# Altium footprint library 13-IC Packages-2smt4e.PcbLib: 49 footprints (part 4 of 4)
Each footprint in its own frame and in the unit in brackets; x right, y up, seen from the top. Pads: shape width x height; smd on the part's side, far side on the other; paste and mask are expansions set on the pad; w line width, h text height; cw(c..) or ccw(c..) is an arc to the next point about the centre after c.
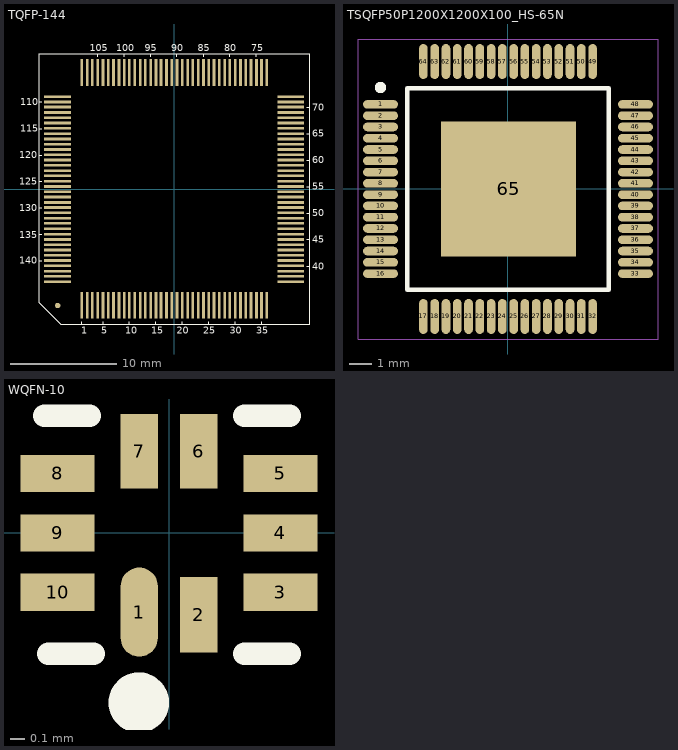
[diagram p3: the footprints below, top view; thin cyan lines are the x and y axes]

## TQFP-144 [mil]
pads (145):
  round 20 smd: 0(-434,-434)
  rect 10x100 smd: 1(-344,-433) 2(-324,-433) 3(-305,-433) 4(-285,-433) 5(-265,-433) 6(-246,-433) 7(-226,-433) 8(-206,-433) 9(-186,-433) 10(-167,-433) 11(-147,-433) 12(-127,-433) 13(-108,-433) 14(-88,-433) 15(-68,-433) 16(-49,-433) 17(-29,-433) 18(-9,-433) 19(10,-433) 20(30,-433) 21(50,-433) 22(69,-433) 23(89,-433) 24(109,-433) 25(128,-433) 26(148,-433) 27(168,-433) 28(188,-433) 29(207,-433) 30(227,-433) 31(247,-433) 32(266,-433) 33(286,-433) 34(306,-433) 35(325,-433) 36(345,-433) 73(345,434) 74(325,434) 75(306,434) 76(286,434) 77(266,434) 78(247,434) 79(227,434) 80(207,434) 81(188,434) 82(168,434) 83(148,434) 84(128,434) 85(109,434) 86(89,434) 87(69,434) 88(50,434) 89(30,434) 90(10,434) 91(-9,434) 92(-29,434) 93(-49,434) 94(-68,434) 95(-88,434) 96(-108,434) 97(-127,434) 98(-147,434) 99(-167,434) 100(-186,434) 101(-206,434) 102(-226,434) 103(-246,434) 104(-265,434) 105(-285,434) 106(-305,434) 107(-324,434) 108(-344,434)
  rect 100x10 smd: 37(434,-345) 38(434,-325) 39(434,-306) 40(434,-286) 41(434,-266) 42(434,-247) 43(434,-227) 44(434,-207) 45(434,-188) 46(434,-168) 47(434,-148) 48(434,-128) 49(434,-109) 50(434,-89) 51(434,-69) 52(434,-50) 53(434,-30) 54(434,-10) 55(434,9) 56(434,29) 57(434,49) 58(434,68) 59(434,88) 60(434,108) 61(434,127) 62(434,147) 63(434,167) 64(434,186) 65(434,206) 66(434,226) 67(434,246) 68(434,265) 69(434,285) 70(434,305) 71(434,324) 72(434,344) 109(-434,344) 110(-434,324) 111(-434,305) 112(-434,285) 113(-434,265) 114(-434,246) 115(-434,226) 116(-434,206) 117(-434,186) 118(-434,167) 119(-434,147) 120(-434,127) 121(-434,108) 122(-434,88) 123(-434,68) 124(-434,49) 125(-434,29) 126(-434,9) 127(-434,-10) 128(-434,-30) 129(-434,-50) 130(-434,-69) 131(-434,-89) 132(-434,-109) 133(-434,-128) 134(-434,-148) 135(-434,-168) 136(-434,-188) 137(-434,-207) 138(-434,-227) 139(-434,-247) 140(-434,-266) 141(-434,-286) 142(-434,-306) 143(-434,-325) 144(-434,-345)
Top Overlay:
  lines w2: -503,-267 -493,-267 ; -503,-168 -493,-168 ; -503,-70 -493,-70 ; -503,28 -493,28 ; -503,126 -493,126 ; -503,225 -493,225 ; -503,324 -493,324 ; -344,-504 -344,-494 ; -285,493 -285,503 ; -265,-504 -265,-494 ; -186,493 -186,503 ; -167,-504 -167,-494 ; -88,493 -88,503 ; -68,-504 -68,-494 ; 10,493 10,503 ; 30,-504 30,-494 ; 109,493 109,503 ; 128,-504 128,-494 ; 207,493 207,503 ; 227,-504 227,-494 ; 306,493 306,503 ; 325,-504 325,-494 ; 494,-287 504,-287 ; 494,-188 504,-188 ; 494,-90 504,-90 ; 494,8 504,8 ; 494,107 504,107 ; 494,206 504,206 ; 494,305 504,305 ; -503,-424 -503,503 504,503 504,-504 -423,-504 -503,-424
  text "140" at -578,-279 h26
  text "135" at -578,-183 h26
  text "130" at -577,-83 h26
  text "125" at -577,15 h26
  text "120" at -577,115 h26
  text "115" at -573,214 h26
  text "110" at -574,312 h26
  text "105" at -315,513 h26
  text "100" at -216,513 h26
  text "95" at -109,513 h26
  text "90" at -11,513 h26
  text "85" at 87,513 h26
  text "80" at 186,513 h26
  text "75" at 286,513 h26
  text "70" at 513,292 h26
  text "65" at 513,194 h26
  text "60" at 513,95 h26
  text "55" at 513,-3 h26
  text "50" at 513,-101 h26
  text "45" at 513,-200 h26
  text "40" at 513,-301 h26
  text "35" at 306,-539 h26
  text "30" at 207,-539 h26
  text "25" at 108,-539 h26
  text "20" at 10,-539 h26
  text "15" at -85,-539 h26
  text "10" at -183,-539 h26
  text "5" at -272,-539 h26
  text "1" at -346,-539 h26
3D body "quad144.stp": height 59.06, standoff 0, extent -433.07,-433.06 433.08,433.08

## TSQFP50P1200X1200X100_HS-65N [mm]
pads (65):
  oval 1.55x0.38 smd mask+0.051: 1(-5.65,3.75) 2(-5.65,3.25) 3(-5.65,2.75) 4(-5.65,2.25) 5(-5.65,1.75) 6(-5.65,1.25) 7(-5.65,0.75) 8(-5.65,0.25) 9(-5.65,-0.25) 10(-5.65,-0.75) 11(-5.65,-1.25) 12(-5.65,-1.75) 13(-5.65,-2.25) 14(-5.65,-2.75) 15(-5.65,-3.25) 16(-5.65,-3.75) 33(5.65,-3.75) 34(5.65,-3.25) 35(5.65,-2.75) 36(5.65,-2.25) 37(5.65,-1.75) 38(5.65,-1.25) 39(5.65,-0.75) 40(5.65,-0.25) 41(5.65,0.25) 42(5.65,0.75) 43(5.65,1.25) 44(5.65,1.75) 45(5.65,2.25) 46(5.65,2.75) 47(5.65,3.25) 48(5.65,3.75)
  oval 0.38x1.55 smd mask+0.051: 17(-3.75,-5.65) 18(-3.25,-5.65) 19(-2.75,-5.65) 20(-2.25,-5.65) 21(-1.75,-5.65) 22(-1.25,-5.65) 23(-0.75,-5.65) 24(-0.25,-5.65) 25(0.25,-5.65) 26(0.75,-5.65) 27(1.25,-5.65) 28(1.75,-5.65) 29(2.25,-5.65) 30(2.75,-5.65) 31(3.25,-5.65) 32(3.75,-5.65) 49(3.75,5.65) 50(3.25,5.65) 51(2.75,5.65) 52(2.25,5.65) 53(1.75,5.65) 54(1.25,5.65) 55(0.75,5.65) 56(0.25,5.65) 57(-0.25,5.65) 58(-0.75,5.65) 59(-1.25,5.65) 60(-1.75,5.65) 61(-2.25,5.65) 62(-2.75,5.65) 63(-3.25,5.65) 64(-3.75,5.65)
  rect 6x6 smd mask+0.051: 65(0.025,0)
Top Overlay:
  circle w0.25: c-5.65,4.5 r0.125
  lines w0.2: -4.475,-4.475 4.475,-4.475 4.475,4.475 -4.475,4.475 -4.475,-4.475
Mechanical 15:
  lines w0.05: -6.65,-6.65 6.65,-6.65 6.65,6.65 -6.65,6.65 -6.65,-6.65
  lines w0.1: -0.5,0 0.5,0 ; 0,-0.5 0,0.5
3D body "0_4-1_55.stp": height 0.02, standoff 0, extent -3.95,4.875 -3.55,6.425
3D body "0_4-1_55.stp": height 0.02, standoff 0, extent -3.45,4.875 -3.05,6.425
3D body "0_4-1_55.stp": height 0.02, standoff 0, extent -2.95,4.875 -2.55,6.425
3D body "0_4-1_55.stp": height 0.02, standoff 0, extent -2.45,4.875 -2.05,6.425
3D body "0_4-1_55.stp": height 0.02, standoff 0, extent -1.95,4.875 -1.55,6.425
3D body "0_4-1_55.stp": height 0.02, standoff 0, extent -1.45,4.875 -1.05,6.425
3D body "0_4-1_55.stp": height 0.02, standoff 0, extent -0.95,4.875 -0.55,6.425
3D body "0_4-1_55.stp": height 0.02, standoff 0, extent -0.45,4.875 -0.05,6.425
3D body "0_4-1_55.stp": height 0.02, standoff 0, extent 0.05,4.875 0.45,6.425
3D body "0_4-1_55.stp": height 0.02, standoff 0, extent 0.55,4.875 0.95,6.425
3D body "0_4-1_55.stp": height 0.02, standoff 0, extent 1.05,4.875 1.45,6.425
3D body "0_4-1_55.stp": height 0.02, standoff 0, extent 1.55,4.875 1.95,6.425
3D body "0_4-1_55.stp": height 0.02, standoff 0, extent 2.05,4.875 2.45,6.425
3D body "0_4-1_55.stp": height 0.02, standoff 0, extent 2.569,4.889 2.969,6.439
3D body "0_4-1_55.stp": height 0.02, standoff 0, extent 3.05,4.875 3.45,6.425
3D body "0_4-1_55.stp": height 0.02, standoff 0, extent 3.55,4.875 3.95,6.425
3D body "0_4-1_55.stp": height 0.02, standoff 0, extent 4.875,3.55 6.425,3.95
3D body "0_4-1_55.stp": height 0.02, standoff 0, extent 4.875,3.05 6.425,3.45
3D body "0_4-1_55.stp": height 0.02, standoff 0, extent 4.875,2.55 6.425,2.95
3D body "0_4-1_55.stp": height 0.02, standoff 0, extent 4.875,2.05 6.425,2.45
3D body "0_4-1_55.stp": height 0.02, standoff 0, extent 4.875,1.55 6.425,1.95
3D body "0_4-1_55.stp": height 0.02, standoff 0, extent 4.875,1.05 6.425,1.45
3D body "0_4-1_55.stp": height 0.02, standoff 0, extent 4.875,0.55 6.425,0.95
3D body "0_4-1_55.stp": height 0.02, standoff 0, extent 4.875,0.05 6.425,0.45
3D body "0_4-1_55.stp": height 0.02, standoff 0, extent 4.875,-0.45 6.425,-0.05
3D body "0_4-1_55.stp": height 0.02, standoff 0, extent 4.875,-0.95 6.425,-0.55
3D body "0_4-1_55.stp": height 0.02, standoff 0, extent 4.875,-1.45 6.425,-1.05
3D body "0_4-1_55.stp": height 0.02, standoff 0, extent 4.875,-1.95 6.425,-1.55
3D body "0_4-1_55.stp": height 0.02, standoff 0, extent 4.875,-2.45 6.425,-2.05
3D body "0_4-1_55.stp": height 0.02, standoff 0, extent 4.875,-2.95 6.425,-2.55
3D body "0_4-1_55.stp": height 0.02, standoff 0, extent 4.875,-3.45 6.425,-3.05
3D body "0_4-1_55.stp": height 0.02, standoff 0, extent 4.875,-3.95 6.425,-3.55
3D body "0_4-1_55.stp": height 0.02, standoff 0, extent 3.55,-6.425 3.95,-4.875
3D body "0_4-1_55.stp": height 0.02, standoff 0, extent 3.05,-6.425 3.45,-4.875
3D body "0_4-1_55.stp": height 0.02, standoff 0, extent 2.55,-6.425 2.95,-4.875
3D body "0_4-1_55.stp": height 0.02, standoff 0, extent 2.05,-6.425 2.45,-4.875
3D body "0_4-1_55.stp": height 0.02, standoff 0, extent 1.55,-6.425 1.95,-4.875
3D body "0_4-1_55.stp": height 0.02, standoff 0, extent 1.05,-6.425 1.45,-4.875
3D body "0_4-1_55.stp": height 0.02, standoff 0, extent 0.55,-6.425 0.95,-4.875
3D body "0_4-1_55.stp": height 0.02, standoff 0, extent 0.05,-6.425 0.45,-4.875
3D body "0_4-1_55.stp": height 0.02, standoff 0, extent -0.45,-6.425 -0.05,-4.875
3D body "0_4-1_55.stp": height 0.02, standoff 0, extent -0.95,-6.425 -0.55,-4.875
3D body "0_4-1_55.stp": height 0.02, standoff 0, extent -1.45,-6.425 -1.05,-4.875
3D body "0_4-1_55.stp": height 0.02, standoff 0, extent -1.95,-6.425 -1.55,-4.875
3D body "0_4-1_55.stp": height 0.02, standoff 0, extent -2.45,-6.425 -2.05,-4.875
3D body "0_4-1_55.stp": height 0.02, standoff 0, extent -2.95,-6.425 -2.55,-4.875
3D body "0_4-1_55.stp": height 0.02, standoff 0, extent -3.45,-6.425 -3.05,-4.875
3D body "0_4-1_55.stp": height 0.02, standoff 0, extent -3.95,-6.425 -3.55,-4.875
3D body "0_4-1_55.stp": height 0.02, standoff 0, extent -6.425,-3.95 -4.875,-3.55
3D body "0_4-1_55.stp": height 0.02, standoff 0, extent -6.425,-3.45 -4.875,-3.05
3D body "0_4-1_55.stp": height 0.02, standoff 0, extent -6.425,-2.95 -4.875,-2.55
3D body "0_4-1_55.stp": height 0.02, standoff 0, extent -6.425,-2.45 -4.875,-2.05
3D body "0_4-1_55.stp": height 0.02, standoff 0, extent -6.425,-1.95 -4.875,-1.55
3D body "0_4-1_55.stp": height 0.02, standoff 0, extent -6.425,-1.45 -4.875,-1.05
3D body "0_4-1_55.stp": height 0.02, standoff 0, extent -6.425,-0.95 -4.875,-0.55
3D body "0_4-1_55.stp": height 0.02, standoff 0, extent -6.425,-0.45 -4.875,-0.05
3D body "0_4-1_55.stp": height 0.02, standoff 0, extent -6.425,0.05 -4.875,0.45
3D body "0_4-1_55.stp": height 0.02, standoff 0, extent -6.425,0.55 -4.875,0.95
3D body "0_4-1_55.stp": height 0.02, standoff 0, extent -6.425,1.05 -4.875,1.45
3D body "0_4-1_55.stp": height 0.02, standoff 0, extent -6.425,1.55 -4.875,1.95
3D body "0_4-1_55.stp": height 0.02, standoff 0, extent -6.425,2.05 -4.875,2.45
3D body "0_4-1_55.stp": height 0.02, standoff 0, extent -6.425,2.55 -4.875,2.95
3D body "0_4-1_55.stp": height 0.02, standoff 0, extent -6.425,3.05 -4.875,3.45
3D body "0_4-1_55.stp": height 0.02, standoff 0, extent -6.425,3.55 -4.875,3.95
3D body "ad7760-qfn65.stp": height 1.16, standoff -0.02, extent -6.1,-6.1 6.1,6.1

## WQFN-10 [mm]
pads (10):
  oval 0.25x0.6 smd mask+0.051: 1(-0.2,-0.533)
  rect 0.25x0.508 smd mask+0.051: 2(0.2,-0.55)
  rect 0.5x0.25 smd mask+0.051: 3(0.75,-0.4) 5(0.75,0.4) 9(-0.75,0) 10(-0.75,-0.4)
  rect 0.5x0.25 smd mask+0: 4(0.75,0) 8(-0.75,0.4)
  rect 0.25x0.5 smd mask+0.051: 6(0.2,0.55) 7(-0.2,0.55)
Top Overlay:
  circle w0.254: c-0.203,-1.143 r0.076
  lines w0.152: -0.838,0.787 -0.533,0.787 ; -0.813,-0.813 -0.508,-0.813 ; 0.508,-0.813 0.813,-0.813 ; 0.508,0.787 0.813,0.787
3D body "wqfn-10.stp": height 0.75, standoff -0.02, extent -0.9,-0.711 0.9,0.689